# Altium footprint library PcbLib1.PcbLib: 54 footprints (part 3 of 4)
Each footprint in its own frame and in the unit in brackets; x right, y up, seen from the top. Pads: shape width x height; smd on the part's side, far side on the other; paste and mask are expansions set on the pad; w line width, h text height; cw(c..) or ccw(c..) is an arc to the next point about the centre after c.
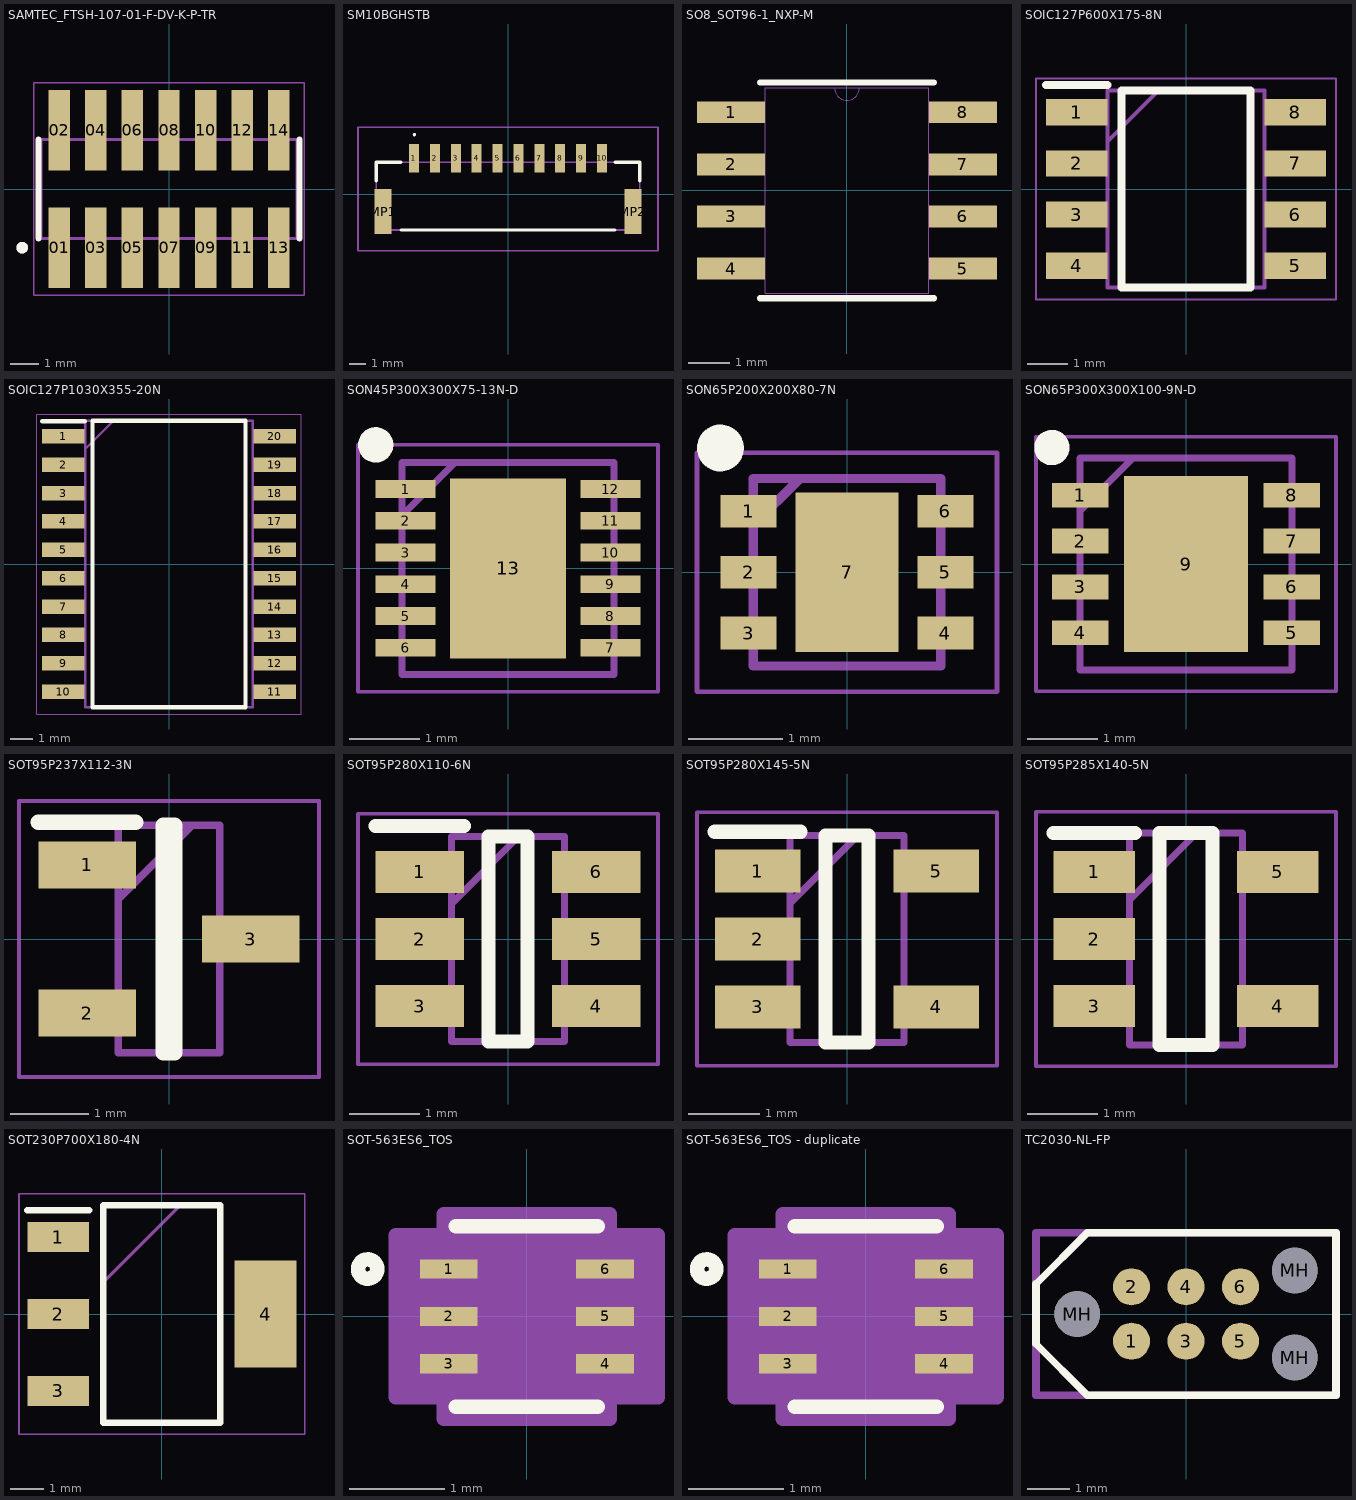
[diagram p2: the footprints below, top view; thin cyan lines are the x and y axes]

## SAMTEC_FTSH-107-01-F-DV-K-P-TR [mm]
pads (14):
  rect 0.74x2.79 smd: 01(-3.81,-2.035) 02(-3.81,2.035) 03(-2.54,-2.035) 04(-2.54,2.035) 05(-1.27,-2.035) 06(-1.27,2.035) 07(0,-2.035) 08(0,2.035) 09(1.27,-2.035) 10(1.27,2.035) 11(2.54,-2.035) 12(2.54,2.035) 13(3.81,-2.035) 14(3.81,2.035)
Top Overlay:
  circle w0.2: c-5.095,-2.035 r0.1
  lines w0.2: -4.53,-1.715 -4.53,1.715 ; 4.53,-1.715 4.53,1.715
Mechanical 13:
  circle w0.2: c-5.095,-2.035 r0.1
  lines w0.1: -4.445,-1.715 -4.445,1.715 ; -4.445,-1.715 4.445,-1.715 ; -4.445,-1.715 -4.445,1.715 ; -4.445,1.715 4.445,1.715 ; -4.445,1.715 4.445,1.715 ; 4.445,-1.715 4.445,1.715 ; 4.445,-1.715 4.445,1.715
Mechanical 15:
  lines w0.05: -4.695,-3.68 -4.695,3.68 4.695,3.68 4.695,-3.68 -4.695,-3.68
3D body "FTSH-107-01-F-DV-K-P-TR.step": height 6.96, standoff -0.03, extent -4.445,-4.318 4.445,3.048

## SM10BGHSTB [mm]
pads (12):
  rect 0.6x1.7 smd: 1(-5.625,2.15) 2(-4.375,2.15) 3(-3.125,2.15) 4(-1.875,2.15) 5(-0.625,2.15) 6(0.625,2.15) 7(1.875,2.15) 8(3.125,2.15) 9(4.375,2.15) 10(5.625,2.15)
  rect 1x2.7 smd: MP1(-7.475,-1.05) MP2(7.475,-1.05)
Top Overlay:
  lines w0.1: -5.6,3.5 cw(c-5.6,3.55) -5.6,3.6 cw(c-5.6,3.55) -5.6,3.5
  lines w0.2: -7.875,0.8 -7.875,1.9 -6.4,1.9 ; -6.4,-2.15 6.4,-2.15 ; 6.4,1.9 7.875,1.9 7.875,0.8
Mechanical 13:
  lines w0.1: -7.875,-2.15 7.875,-2.15 7.875,1.9 -7.875,1.9 -7.875,-2.15
Mechanical 15:
  lines w0.1: -8.975,-3.4 8.975,-3.4 8.975,4 -8.975,4 -8.975,-3.4
3D body "SM10B-GHS-TB.stp": height 4.35, standoff 0, extent -7.875,-2.3 7.875,2.94

## SO8_SOT96-1_NXP-M [mil]
pads (8):
  rect 65.5x21 smd paste+0 mask+0: 1(-111.25,75) 2(-111.25,25) 3(-111.25,-25) 4(-111.25,-75) 5(111.25,-75) 6(111.25,-25) 7(111.25,25) 8(111.25,75)
Top Overlay:
  lines w6: -83.5,-103.5 83.5,-103.5 ; -83.5,103.5 83.5,103.5
Mechanical 13:
  lines w0: -12,98.5 ccw(c0,98.5) 12,98.5
  lines w1: -122,-84.5 -122,-65.5 -78.5,-65.5 -78.5,-84.5 -122,-84.5 ; -122,-34.5 -122,-15.5 -78.5,-15.5 -78.5,-34.5 -122,-34.5 ; -122,15.5 -122,34.5 -78.5,34.5 -78.5,15.5 -122,15.5 ; -122,65.5 -122,84.5 -78.5,84.5 -78.5,65.5 -122,65.5 ; -78.5,-98.5 78.5,-98.5 78.5,98.5 -78.5,98.5 -78.5,-98.5 ; 78.5,-84.5 78.5,-65.5 122,-65.5 122,-84.5 78.5,-84.5 ; 78.5,-34.5 78.5,-15.5 122,-15.5 122,-34.5 78.5,-34.5 ; 78.5,15.5 78.5,34.5 122,34.5 122,15.5 78.5,15.5 ; 78.5,65.5 78.5,84.5 122,84.5 122,65.5 78.5,65.5
  text "*" at -76,45.5 h50
3D body "SO8_SOT96-1_NXP.step": height 69.09, standoff 0, extent -122.01,-98.5 122.01,98.5

## SOIC127P600X175-8N [mm]
pads (8):
  rect 1.525x0.65 smd: 1(-2.712,1.905) 2(-2.712,0.635) 3(-2.712,-0.635) 4(-2.712,-1.905) 5(2.712,-1.905) 6(2.712,-0.635) 7(2.712,0.635) 8(2.712,1.905)
Top Overlay:
  lines w0.2: -3.475,2.58 -1.95,2.58 ; -1.6,-2.45 -1.6,2.45 1.6,2.45 1.6,-2.45 -1.6,-2.45
Mechanical 13:
  lines w0.1: -1.95,1.18 -0.68,2.45 ; -1.95,-2.45 -1.95,2.45 1.95,2.45 1.95,-2.45 -1.95,-2.45
Mechanical 15:
  lines w0.05: -3.725,-2.75 -3.725,2.75 3.725,2.75 3.725,-2.75 -3.725,-2.75
3D body "SN65HVD78DR.stp": height 1.63, standoff 0, extent -3.011,-2.451 3.011,2.451

## SOIC127P1030X355-20N [mm]
pads (20):
  rect 1.9x0.65 smd: 1(-4.725,5.715) 2(-4.725,4.445) 3(-4.725,3.175) 4(-4.725,1.905) 5(-4.725,0.635) 6(-4.725,-0.635) 7(-4.725,-1.905) 8(-4.725,-3.175) 9(-4.725,-4.445) 10(-4.725,-5.715) 11(4.725,-5.715) 12(4.725,-4.445) 13(4.725,-3.175) 14(4.725,-1.905) 15(4.725,-0.635) 16(4.725,0.635) 17(4.725,1.905) 18(4.725,3.175) 19(4.725,4.445) 20(4.725,5.715)
Top Overlay:
  lines w0.2: -5.675,6.39 -3.775,6.39 ; -3.425,-6.415 3.425,-6.415 3.425,6.415 -3.425,6.415 -3.425,-6.415
Mechanical 13:
  lines w0.1: -3.75,5.145 -2.48,6.415 ; -3.75,-6.415 3.75,-6.415 3.75,6.415 -3.75,6.415 -3.75,-6.415
Mechanical 15:
  lines w0.05: -5.925,-6.715 5.925,-6.715 5.925,6.715 -5.925,6.715 -5.925,-6.715
3D body "ISOW1044BDFMR.stp": height 3.55, standoff 0, extent -5.15,-6.477 5.15,6.353

## SON45P300X300X75-13N-D [mm]
pads (13):
  rect 0.85x0.25 smd: 1(-1.45,1.125) 2(-1.45,0.675) 3(-1.45,0.225) 4(-1.45,-0.225) 5(-1.45,-0.675) 6(-1.45,-1.125) 7(1.45,-1.125) 8(1.45,-0.675) 9(1.45,-0.225) 10(1.45,0.225) 11(1.45,0.675) 12(1.45,1.125)
  rect 1.65x2.55 smd: 13(0,0)
Top Overlay:
  circle w0.25: c-1.875,1.75 r0.125
Mechanical 13:
  lines w0.1: -1.5,0.75 -0.75,1.5 ; -1.5,-1.5 1.5,-1.5 1.5,1.5 -1.5,1.5 -1.5,-1.5
Mechanical 15:
  lines w0.05: -2.125,-1.75 2.125,-1.75 2.125,1.75 -2.125,1.75 -2.125,-1.75
3D body "FT234XD-R.stp": height 0.75, standoff 0, extent -1.55,-1.5 1.55,1.5

## SON65P200X200X80-7N [mm]
pads (7):
  rect 0.6x0.35 smd: 1(-1.05,0.65) 2(-1.05,0) 3(-1.05,-0.65) 4(1.05,-0.65) 5(1.05,0) 6(1.05,0.65)
  rect 1.1x1.7 smd: 7(0,0)
Top Overlay:
  circle w0.25: c-1.35,1.325 r0.125
Mechanical 13:
  lines w0.1: -1,0.5 -0.5,1 ; -1,-1 1,-1 1,1 -1,1 -1,-1
Mechanical 15:
  lines w0.05: -1.6,-1.275 1.6,-1.275 1.6,1.275 -1.6,1.275 -1.6,-1.275
3D body "LDH40PUR.stp": height 0.8, standoff 0, extent -1.05,-1 1.05,1

## SON65P300X300X100-9N-D [mm]
pads (9):
  rect 0.8x0.35 smd: 1(-1.5,0.975) 2(-1.5,0.325) 3(-1.5,-0.325) 4(-1.5,-0.975) 5(1.5,-0.975) 6(1.5,-0.325) 7(1.5,0.325) 8(1.5,0.975)
  rect 1.75x2.5 smd: 9(0,0)
Top Overlay:
  circle w0.25: c-1.9,1.65 r0.125
Mechanical 13:
  lines w0.1: -1.5,0.75 -0.75,1.5 ; -1.5,-1.5 1.5,-1.5 1.5,1.5 -1.5,1.5 -1.5,-1.5
Mechanical 15:
  lines w0.05: -2.125,-1.8 2.125,-1.8 2.125,1.8 -2.125,1.8 -2.125,-1.8
3D body "TPS78518QWDRBRQ1.stp": height 1, standoff 0, extent -1.5,-1.5 1.5,1.5

## SOT95P237X112-3N [mm]
pads (3):
  rect 1.25x0.6 smd: 1(-1.05,0.95) 2(-1.05,-0.95) 3(1.05,0)
Top Overlay:
  lines w0.2: -1.675,1.5 -0.425,1.5 ; -0.075,-1.46 -0.075,1.46 0.075,1.46 0.075,-1.46 -0.075,-1.46
Mechanical 13:
  lines w0.1: -0.65,0.51 0.3,1.46 ; -0.65,-1.46 -0.65,1.46 0.65,1.46 0.65,-1.46 -0.65,-1.46
Mechanical 15:
  lines w0.05: -1.925,-1.77 -1.925,1.77 1.925,1.77 1.925,-1.77 -1.925,-1.77
3D body "ESD2CAN24DBZRQ1.stp": height 1.12, standoff 0, extent -1.185,-1.46 1.185,1.46

## SOT95P280X110-6N [mm]
pads (6):
  rect 1.25x0.6 smd: 1(-1.25,0.95) 2(-1.25,0) 3(-1.25,-0.95) 4(1.25,-0.95) 5(1.25,0) 6(1.25,0.95)
Top Overlay:
  lines w0.2: -1.875,1.6 -0.625,1.6 ; -0.275,-1.45 -0.275,1.45 0.275,1.45 0.275,-1.45 -0.275,-1.45
Mechanical 13:
  lines w0.1: -0.8,0.5 0.15,1.45 ; -0.8,-1.45 -0.8,1.45 0.8,1.45 0.8,-1.45 -0.8,-1.45
Mechanical 15:
  lines w0.05: -2.125,-1.775 -2.125,1.775 2.125,1.775 2.125,-1.775 -2.125,-1.775
3D body "TPS54202DDCR.stp": height 1.1, standoff 0, extent -1.4,-1.45 1.4,1.45

## SOT95P280X145-5N [mm]
pads (5):
  rect 1.2x0.6 smd: 1(-1.25,0.95) 2(-1.25,0) 3(-1.25,-0.95) 4(1.25,-0.95) 5(1.25,0.95)
Top Overlay:
  lines w0.2: -1.85,1.5 -0.65,1.5 ; -0.3,-1.45 -0.3,1.45 0.3,1.45 0.3,-1.45 -0.3,-1.45
Mechanical 13:
  lines w0.1: -0.8,0.5 0.15,1.45 ; -0.8,-1.45 -0.8,1.45 0.8,1.45 0.8,-1.45 -0.8,-1.45
Mechanical 15:
  lines w0.05: -2.1,-1.775 -2.1,1.775 2.1,1.775 2.1,-1.775 -2.1,-1.775
3D body "LP5907MFX-3.0_NOPB.stp": height 1.2, standoff 0, extent -1.4,-1.45 1.4,1.45

## SOT95P285X140-5N [mm]
pads (5):
  rect 1.15x0.6 smd: 1(-1.3,0.95) 2(-1.3,0) 3(-1.3,-0.95) 4(1.3,-0.95) 5(1.3,0.95)
Top Overlay:
  lines w0.2: -1.875,1.5 -0.725,1.5 ; -0.375,-1.5 0.375,-1.5 0.375,1.5 -0.375,1.5 -0.375,-1.5
Mechanical 13:
  lines w0.1: -0.8,0.55 0.15,1.5 ; -0.8,-1.5 0.8,-1.5 0.8,1.5 -0.8,1.5 -0.8,-1.5
Mechanical 15:
  lines w0.05: -2.125,-1.8 2.125,-1.8 2.125,1.8 -2.125,1.8 -2.125,-1.8
3D body "AP2112K-3.3TRG1.stp": height 1.4, standoff 0, extent -1.425,-1.5 1.425,1.5

## SOT230P700X180-4N [mm]
pads (4):
  rect 1.85x0.9 smd: 1(-3.1,2.3) 2(-3.1,0) 3(-3.1,-2.3)
  rect 1.85x3.2 smd: 4(3.1,0)
Top Overlay:
  lines w0.2: -4.025,3.1 -2.175,3.1 ; -1.75,-3.25 -1.75,3.25 1.75,3.25 1.75,-3.25 -1.75,-3.25
Mechanical 13:
  lines w0.1: -1.75,0.95 0.55,3.25 ; -1.75,-3.25 -1.75,3.25 1.75,3.25 1.75,-3.25 -1.75,-3.25
Mechanical 15:
  lines w0.05: -4.275,-3.6 -4.275,3.6 4.275,3.6 4.275,-3.6 -4.275,-3.6
3D body "AZ1117IH-3.3TRG1.stp": height 1.8, standoff 0, extent -3.5,-3.25 3.5,3.25

## SOT-563ES6_TOS [mil]
pads (6):
  rect 24x8 smd paste+0 mask+0: 1(-32.5,19.68) 2(-32.5,0) 3(-32.5,-19.68) 4(32.5,-19.68) 5(32.5,0) 6(32.5,19.68)
Top Overlay:
  circle w6: c-66.19,19.68 r4
  lines w6: -29.5,-37.5 29.5,-37.5 ; -29.5,37.5 29.5,37.5
Mechanical 13:
  circle w0: c-20.5,19.68 r3
  lines w0: -12,32.5 ccw(c0,32.5) 12,32.5
  lines w1: -24.5,-32.5 24.5,-32.5 24.5,32.5 -24.5,32.5 -24.5,-32.5
Mechanical 15:
  region: -34.5,-33.69 -54.5,-33.69 -54.5,33.69 -34.5,33.69 -34.5,42.5 34.5,42.5 34.5,33.69 54.5,33.69 54.5,-33.69 34.5,-33.69 34.5,-42.5 -34.5,-42.5
  lines w6: -54.5,-33.69 -54.5,33.69 -34.5,33.69 -34.5,42.5 34.5,42.5 34.5,33.69 54.5,33.69 54.5,-33.69 34.5,-33.69 34.5,-42.5 -34.5,-42.5 -34.5,-33.69 -54.5,-33.69
3D body "SOT-563ES6_TOS.step": height 24.09, standoff 0, extent -32.52,-32.52 32.52,32.52

## SOT-563ES6_TOS - duplicate [mil]
pads (6):
  rect 24x8 smd paste+0 mask+0: 1(-32.5,19.68) 2(-32.5,0) 3(-32.5,-19.68) 4(32.5,-19.68) 5(32.5,0) 6(32.5,19.68)
Top Overlay:
  circle w6: c-66.19,19.68 r4
  lines w6: -29.5,-37.5 29.5,-37.5 ; -29.5,37.5 29.5,37.5
Mechanical 13:
  circle w0: c-20.5,19.68 r3
  lines w0: -12,32.5 ccw(c0,32.5) 12,32.5
  lines w1: -24.5,-32.5 -24.5,32.5 24.5,32.5 24.5,-32.5 -24.5,-32.5
Mechanical 15:
  region: -34.5,-33.69 -54.5,-33.69 -54.5,33.69 -34.5,33.69 -34.5,42.5 34.5,42.5 34.5,33.69 54.5,33.69 54.5,-33.69 34.5,-33.69 34.5,-42.5 -34.5,-42.5
  lines w6: -54.5,-33.69 -34.5,-33.69 -34.5,-42.5 34.5,-42.5 34.5,-33.69 54.5,-33.69 54.5,33.69 34.5,33.69 34.5,42.5 -34.5,42.5 -34.5,33.69 -54.5,33.69 -54.5,-33.69
3D body "SOT-563ES6_TOS.step": height 24.09, standoff 0, extent -32.52,-32.52 32.52,32.52

## TC2030-NL-FP [mil]
pads (9):
  round 33.98 smd paste-16.99: 1(-50,-25) 2(-50,25) 3(0,-25) 4(0,25) 5(50,-25) 6(50,25)
  round 42.01 hole 42.01 unplated: MH(-100,0) MH(100,-40) MH(100,40)
Top Overlay:
  lines w6.89: -137.8,-27.56 -137.8,27.56 -90.55,74.8 137.8,74.8 137.8,-74.8 -90.55,-74.8 -137.8,-27.56
Mechanical 13:
  lines w6.89: -137.8,-74.8 -137.8,74.8 137.8,74.8 137.8,-74.8 -137.8,-74.8
  text "'.Designator'" at -339.89,-24.99 h60